# Altium footprint library Miscellaneous Switch.PcbLib: 115 footprints (part 5 of 8)
Each footprint in its own frame and in the unit in brackets; x right, y up, seen from the top. Pads: shape width x height; smd on the part's side, far side on the other; paste and mask are expansions set on the pad; w line width, h text height; cw(c..) or ccw(c..) is an arc to the next point about the centre after c.
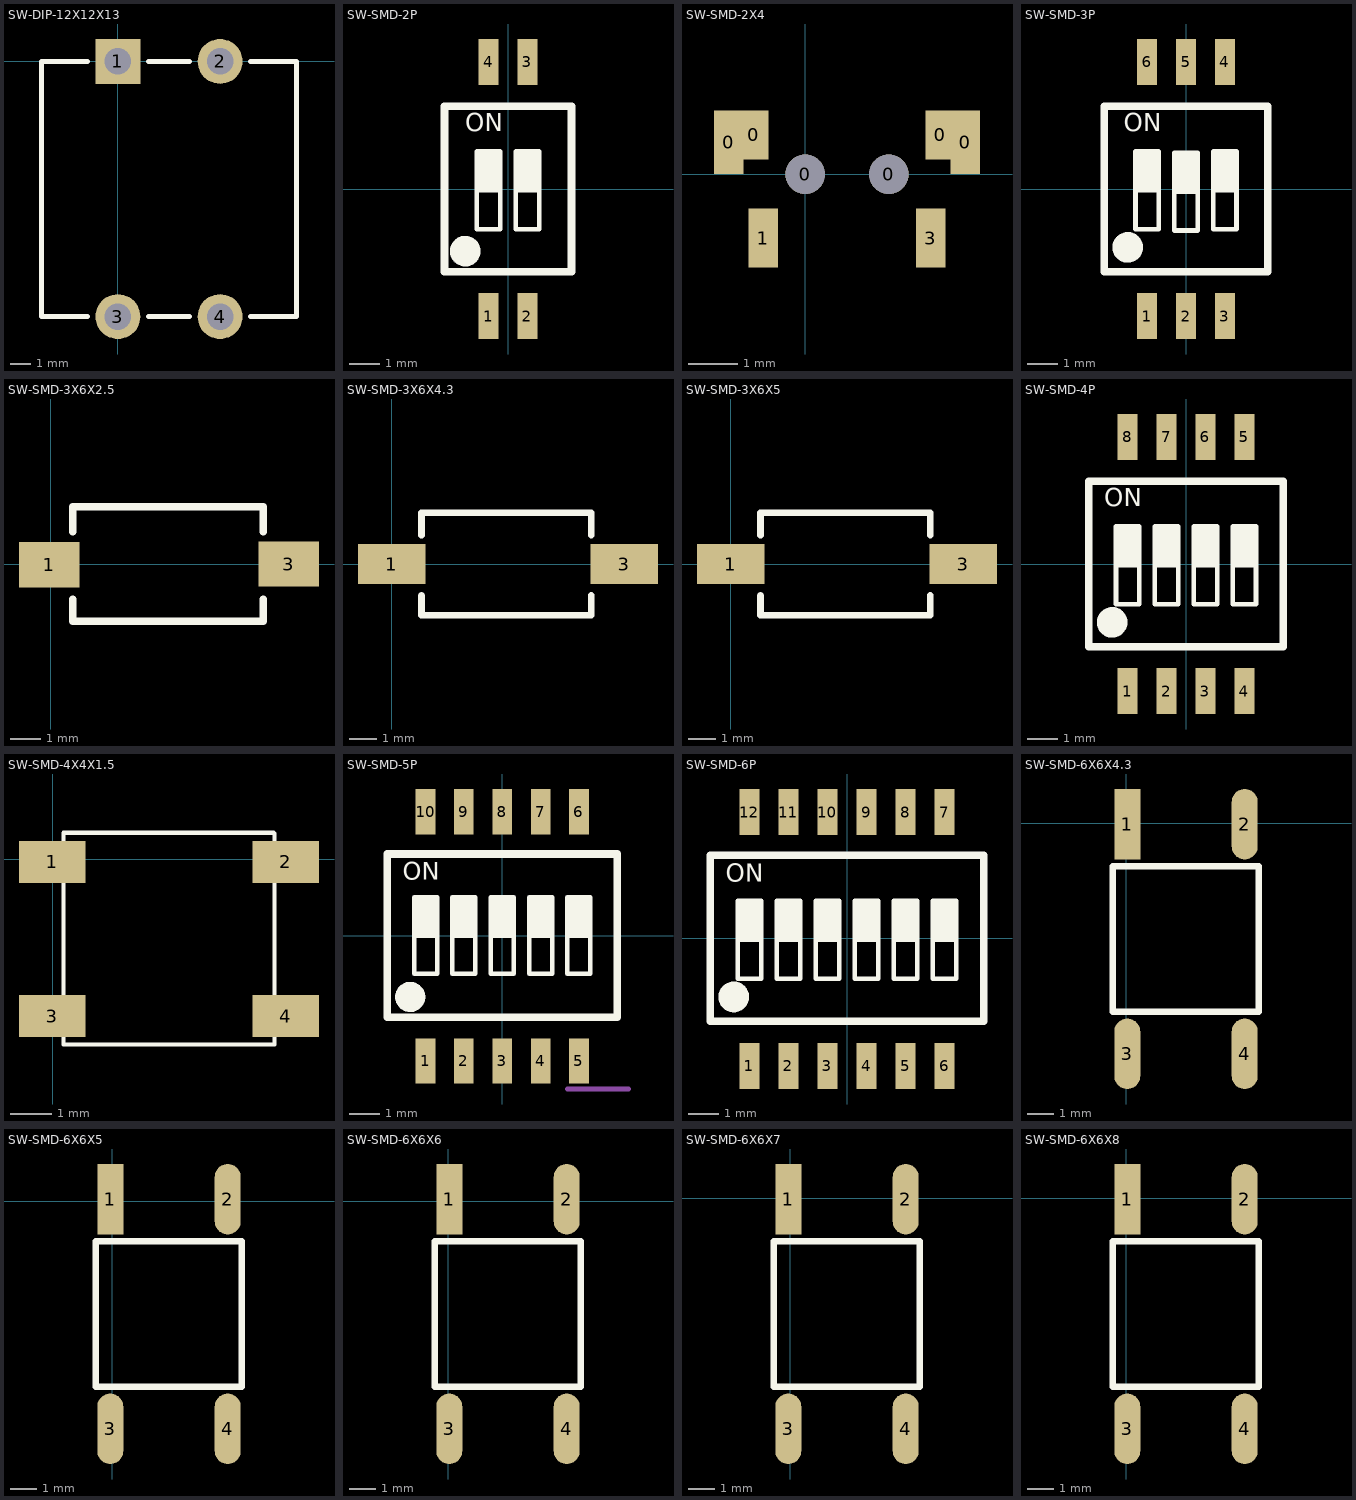
[diagram p4: the footprints below, top view; thin cyan lines are the x and y axes]

## SW-DIP-12X12X13 [mm]
pads (4):
  rect 2.2x2.2 hole 1.3: 1(0,0)
  round 2.2 hole 1.3: 2(5,0) 3(0,-12.5) 4(5,-12.5)
Top Overlay:
  lines w0.254: -1.5,-12.5 -3.75,-12.5 -3.75,0 -1.5,0 ; 1.5,-12.5 3.5,-12.5 ; 1.5,0 3.5,0 ; 6.5,-12.5 8.75,-12.5 8.75,0 6.5,0
3D body "DIP-12X12X13.STEP": height 13.31, standoff -3.19, extent -3.46,-13.208 8.54,0.589

## SW-SMD-2P [mm] "长：4.14mm，宽：5.4mm，高：2.3mm"
pads (4):
  rect 0.65x1.5 smd: 1(-0.635,-4.15) 2(0.635,-4.15) 3(0.635,4.15) 4(-0.635,4.15)
Top Overlay:
  circle w0.5: c-1.397,-2.032 r0.25
  region: -0.254,1.225 -1.016,1.225 -1.016,-0.045 -0.254,-0.045
  region: 1.016,1.225 0.254,1.225 0.254,-0.045 1.016,-0.045
  lines w0.15: -1.016,-0.045 -0.254,-0.045 ; 0.254,-0.045 1.016,-0.045 ; -1.016,-1.315 -0.254,-1.315 -0.254,1.225 -1.016,1.225 -1.016,-1.315 ; 0.254,-1.315 1.016,-1.315 1.016,1.225 0.254,1.225 0.254,-1.315
  lines w0.254: -2.07,-2.7 -2.07,2.7 2.07,2.7 2.07,-2.7 -2.07,-2.7
  text "ON" at -1.397,1.696 h1
3D body "SMD-2P.STEP": height 2.35, standoff 0, extent -2.108,-4.477 2.032,4.223

## SW-SMD-2X4 [mm]
pads (8):
  rect 0.6x1.3 smd: 0(-1.55,0.65) 0(3.25,0.65)
  rect 0.6x1 smd: 0(-1.05,0.8) 0(2.75,0.8)
  round 0.8 hole 0.8: 0(0,0) 0(1.7,0)
  rect 0.6x1.2 smd: 1(-0.85,-1.3) 3(2.55,-1.3)
3D body "User Library-it-1188e.STEP": height 3.5, standoff -0.7, extent -2.974,-1.8 4.826,1.8

## SW-SMD-3P [mm] "长：5.41mm，宽：5.4mm，高：2.3mm"
pads (6):
  rect 0.65x1.5 smd: 1(-1.27,-4.15) 2(0,-4.15) 3(1.27,-4.15) 4(1.27,4.15) 5(0,4.15) 6(-1.27,4.15)
Top Overlay:
  circle w0.5: c-1.905,-1.905 r0.25
  region: -0.889,1.225 -1.651,1.225 -1.651,-0.045 -0.889,-0.045
  region: 0.381,1.184 -0.381,1.184 -0.381,-0.086 0.381,-0.086
  region: 1.651,1.225 0.889,1.225 0.889,-0.045 1.651,-0.045
  lines w0.15: -1.651,-0.045 -0.889,-0.045 ; -0.381,-0.086 0.381,-0.086 ; 0.889,-0.045 1.651,-0.045 ; -1.651,-1.315 -0.889,-1.315 -0.889,1.225 -1.651,1.225 -1.651,-1.315 ; -0.381,-1.356 0.381,-1.356 0.381,1.184 -0.381,1.184 -0.381,-1.356 ; 0.889,-1.315 1.651,-1.315 1.651,1.225 0.889,1.225 0.889,-1.315
  lines w0.254: -2.667,-2.7 -2.667,2.7 2.667,2.7 2.667,-2.7 -2.667,-2.7
  text "ON" at -2.032,1.696 h1
3D body "SMD-3P.STEP": height 2.35, standoff 0, extent -2.743,-4.35 2.667,4.35

## SW-SMD-3X6X2.5 [mm]
pads (2):
  rect 2x1.5 smd: 1(-0.059,-0.02) 3(7.874,0)
Top Overlay:
  lines w0.254: 0.725,-1.168 0.725,-1.9 7.025,-1.9 7.025,-1.168 ; 0.725,1.067 0.725,1.9 7.025,1.9 7.025,1.067
3D body "SMD-3X6X2.5.STEP": height 2.59, standoff -0.03, extent -0.19,-1.778 7.81,1.722

## SW-SMD-3X6X4.3 [mm]
pads (2):
  rect 2.5x1.5 smd: 1(0,0) 3(8.636,0)
Top Overlay:
  lines w0.254: 1.106,-1.168 1.106,-1.9 7.406,-1.9 7.406,-1.168 ; 1.106,1.067 1.106,1.9 7.406,1.9 7.406,1.067
3D body "SMD-3X6X4.3.STEP": height 4.4, standoff -0.03, extent -0.409,-1.778 8.791,1.722

## SW-SMD-3X6X5 [mm]
pads (2):
  rect 2.5x1.5 smd: 1(0,0) 3(8.636,0)
Top Overlay:
  lines w0.254: 1.106,-1.168 1.106,-1.9 7.406,-1.9 7.406,-1.168 ; 1.106,1.067 1.106,1.9 7.406,1.9 7.406,1.067
3D body "SMD-3X6X5.STEP": height 5.1, standoff -0.03, extent -0.409,-1.722 8.791,1.778

## SW-SMD-4P [mm] "长：6.68mm，宽：5.4mm，高：2.3mm"
pads (8):
  rect 0.65x1.5 smd: 1(-1.905,-4.15) 2(-0.635,-4.15) 3(0.635,-4.15) 4(1.905,-4.15) 5(1.905,4.15) 6(0.635,4.15) 7(-0.635,4.15) 8(-1.905,4.15)
Top Overlay:
  circle w0.5: c-2.413,-1.905 r0.25
  region: 2.286,1.225 1.524,1.225 1.524,-0.045 2.286,-0.045
  region: 1.016,1.225 0.254,1.225 0.254,-0.045 1.016,-0.045
  region: -0.254,1.225 -1.016,1.225 -1.016,-0.045 -0.254,-0.045
  region: -1.524,1.225 -2.286,1.225 -2.286,-0.045 -1.524,-0.045
  lines w0.15: -2.286,-0.045 -1.524,-0.045 ; -1.016,-0.045 -0.254,-0.045 ; 0.254,-0.045 1.016,-0.045 ; 1.524,-0.045 2.286,-0.045 ; -2.286,-1.315 -2.286,1.225 -1.524,1.225 -1.524,-1.315 -2.286,-1.315 ; -1.016,-1.315 -1.016,1.225 -0.254,1.225 -0.254,-1.315 -1.016,-1.315 ; 0.254,-1.315 0.254,1.225 1.016,1.225 1.016,-1.315 0.254,-1.315 ; 1.524,-1.315 1.524,1.225 2.286,1.225 2.286,-1.315 1.524,-1.315
  lines w0.254: -3.175,-2.7 3.175,-2.7 3.175,2.7 -3.175,2.7 -3.175,-2.7
  text "ON" at -2.667,1.696 h1
3D body "SMD-4P.STEP": height 2.35, standoff 0, extent -3.378,-4.477 3.302,4.223

## SW-SMD-4X4X1.5 [mm]
pads (4):
  rect 1.6x1 smd: 1(-0.006,-0.065) 2(5.594,-0.065) 3(-0.006,-3.765) 4(5.594,-3.765)
Top Overlay:
  lines w0.1: 5.304,0.635 1.524,0.635 0.264,0.635 0.264,-4.445 5.324,-4.445 5.324,0.615
Mechanical 15:
  lines w0.1: -0.406,-4.015 -0.406,-3.515 0.573,-3.515 ; 5.015,-0.315 5.994,-0.315 5.994,0.185
3D body "SMD-4X4X1.5.STEP": height 1.44, standoff -0.06, extent -0.533,-4.572 5.867,0.628

## SW-SMD-5P [mm] "长：7.95mm，宽：5.4mm，高：2.3mm"
pads (10):
  rect 0.65x1.5 smd: 1(-2.54,-4.15) 2(-1.27,-4.15) 3(0,-4.15) 4(1.27,-4.15) 5(2.54,-4.15) 6(2.54,4.105) 7(1.27,4.105) 8(0,4.105) 9(-1.27,4.105) 10(-2.54,4.105)
Top Overlay:
  circle w0.5: c-3.048,-2.032 r0.25
  region: -2.159,1.27 -2.921,1.27 -2.921,0 -2.159,0
  region: -0.889,1.27 -1.651,1.27 -1.651,0 -0.889,0
  region: 1.651,1.27 0.889,1.27 0.889,0 1.651,0
  region: 2.921,1.27 2.159,1.27 2.159,0 2.921,0
  region: 0.381,1.27 -0.381,1.27 -0.381,0 0.381,0
  lines w0.15: -2.921,0 -2.159,0 ; -1.651,0 -0.889,0 ; -0.381,0 0.381,0 ; 0.889,0 1.651,0 ; 2.159,0 2.921,0 ; -2.921,-1.27 -2.159,-1.27 -2.159,1.27 -2.921,1.27 -2.921,-1.27 ; -1.651,-1.27 -0.889,-1.27 -0.889,1.27 -1.651,1.27 -1.651,-1.27 ; -0.381,-1.27 -0.381,1.27 0.381,1.27 0.381,-1.27 -0.381,-1.27 ; 0.889,-1.27 1.651,-1.27 1.651,1.27 0.889,1.27 0.889,-1.27 ; 2.159,-1.27 2.921,-1.27 2.921,1.27 2.159,1.27 2.159,-1.27
  lines w0.254: -3.81,-2.7 -3.81,2.7 3.81,2.7 3.81,-2.7 -3.81,-2.7
  text "ON" at -3.302,1.651 h1
Mechanical 15:
  lines w0.15: 2.159,-5.08 4.191,-5.08
3D body "SMD-5P.STEP": height 2.35, standoff 0, extent -4.013,-4.35 3.937,4.35

## SW-SMD-6P [mm] "长：9.22mm，宽：5.4mm，高：2.3mm"
pads (12):
  rect 0.65x1.5 smd: 1(-3.175,-4.15) 2(-1.905,-4.15) 3(-0.635,-4.15) 4(0.635,-4.15) 5(1.905,-4.15) 6(3.175,-4.15) 7(3.175,4.105) 8(1.905,4.105) 9(0.635,4.105) 10(-0.635,4.105) 11(-1.905,4.105) 12(-3.175,4.105)
Top Overlay:
  circle w0.5: c-3.683,-1.905 r0.25
  region: 3.556,1.225 2.794,1.225 2.794,-0.045 3.556,-0.045
  region: 2.286,1.225 1.524,1.225 1.524,-0.045 2.286,-0.045
  region: 1.016,1.225 0.254,1.225 0.254,-0.045 1.016,-0.045
  region: -0.254,1.225 -1.016,1.225 -1.016,-0.045 -0.254,-0.045
  region: -1.524,1.225 -2.286,1.225 -2.286,-0.045 -1.524,-0.045
  region: -2.794,1.225 -3.556,1.225 -3.556,-0.045 -2.794,-0.045
  lines w0.15: -3.556,-0.045 -2.794,-0.045 ; -2.286,-0.045 -1.524,-0.045 ; -1.016,-0.045 -0.254,-0.045 ; 0.254,-0.045 1.016,-0.045 ; 1.524,-0.045 2.286,-0.045 ; 2.794,-0.045 3.556,-0.045 ; -3.556,-1.315 -3.556,1.225 -2.794,1.225 -2.794,-1.315 -3.556,-1.315 ; -2.286,-1.315 -2.286,1.225 -1.524,1.225 -1.524,-1.315 -2.286,-1.315 ; -1.016,-1.315 -1.016,1.225 -0.254,1.225 -0.254,-1.315 -1.016,-1.315 ; 0.254,-1.315 0.254,1.225 1.016,1.225 1.016,-1.315 0.254,-1.315 ; 1.524,-1.315 1.524,1.225 2.286,1.225 2.286,-1.315 1.524,-1.315 ; 2.794,-1.315 2.794,1.225 3.556,1.225 3.556,-1.315 2.794,-1.315
  lines w0.254: -4.445,-2.7 4.445,-2.7 4.445,2.7 -4.445,2.7 -4.445,-2.7
  text "ON" at -3.937,1.651 h1
3D body "SMD-6P.STEP": height 2.35, standoff 0, extent -4.572,-4.35 4.648,4.35

## SW-SMD-6X6X4.3 [mm]
pads (4):
  rect 1x2.7 smd: 1(0.047,-0.045)
  oval 1x2.7 smd: 2(4.547,-0.045) 3(0.047,-8.845) 4(4.547,-8.845)
Top Overlay:
  lines w0.254: -0.508,-7.239 -0.508,-1.651 5.08,-1.651 5.08,-7.239 -0.508,-7.239
3D body "SMD-6X6X4.3.STEP": height 4.25, standoff 0.05, extent -0.635,-8.818 5.365,0.182

## SW-SMD-6X6X5 [mm]
pads (4):
  rect 1x2.7 smd: 1(-0.08,0.082)
  oval 1x2.7 smd: 2(4.42,0.082) 3(-0.08,-8.718) 4(4.42,-8.718)
Top Overlay:
  lines w0.254: -0.635,-7.112 4.953,-7.112 4.953,-1.524 -0.635,-1.524 -0.635,-7.112
3D body "SMD-6X6X5.STEP": height 4.95, standoff -0.03, extent -0.793,-8.818 5.207,0.182

## SW-SMD-6X6X6 [mm]
pads (4):
  rect 1x2.7 smd: 1(0.047,0.082)
  oval 1x2.7 smd: 2(4.547,0.082) 3(0.047,-8.718) 4(4.547,-8.718)
Top Overlay:
  lines w0.254: -0.508,-7.112 -0.508,-1.524 5.08,-1.524 5.08,-7.112 -0.508,-7.112
3D body "SMD-6X6X6.STEP": height 5.95, standoff -0.03, extent -0.793,-8.691 5.207,0.309

## SW-SMD-6X6X7 [mm]
pads (4):
  rect 1x2.7 smd: 1(-0.08,-0.045)
  oval 1x2.7 smd: 2(4.42,-0.045) 3(-0.08,-8.845) 4(4.42,-8.845)
Top Overlay:
  lines w0.254: -0.635,-7.239 -0.635,-1.651 4.953,-1.651 4.953,-7.239 -0.635,-7.239
3D body "SMD-6X6X7.STEP": height 6.95, standoff -0.03, extent -0.793,-8.945 5.207,0.055

## SW-SMD-6X6X8 [mm]
pads (4):
  rect 1x2.7 smd: 1(0.047,-0.045)
  oval 1x2.7 smd: 2(4.547,-0.045) 3(0.047,-8.845) 4(4.547,-8.845)
Top Overlay:
  lines w0.254: -0.508,-7.239 -0.508,-1.651 5.08,-1.651 5.08,-7.239 -0.508,-7.239
3D body "SMD-6X6X8.STEP": height 7.95, standoff -0.03, extent -0.793,-8.818 5.207,0.182